# Altium footprint library LUMI_Handy_Soldering_LIB.PcbLib: 562 footprints (part 8 of 36)
Each footprint in its own frame and in the unit in brackets; x right, y up, seen from the top. Pads: shape width x height; smd on the part's side, far side on the other; paste and mask are expansions set on the pad; w line width, h text height; cw(c..) or ccw(c..) is an arc to the next point about the centre after c.
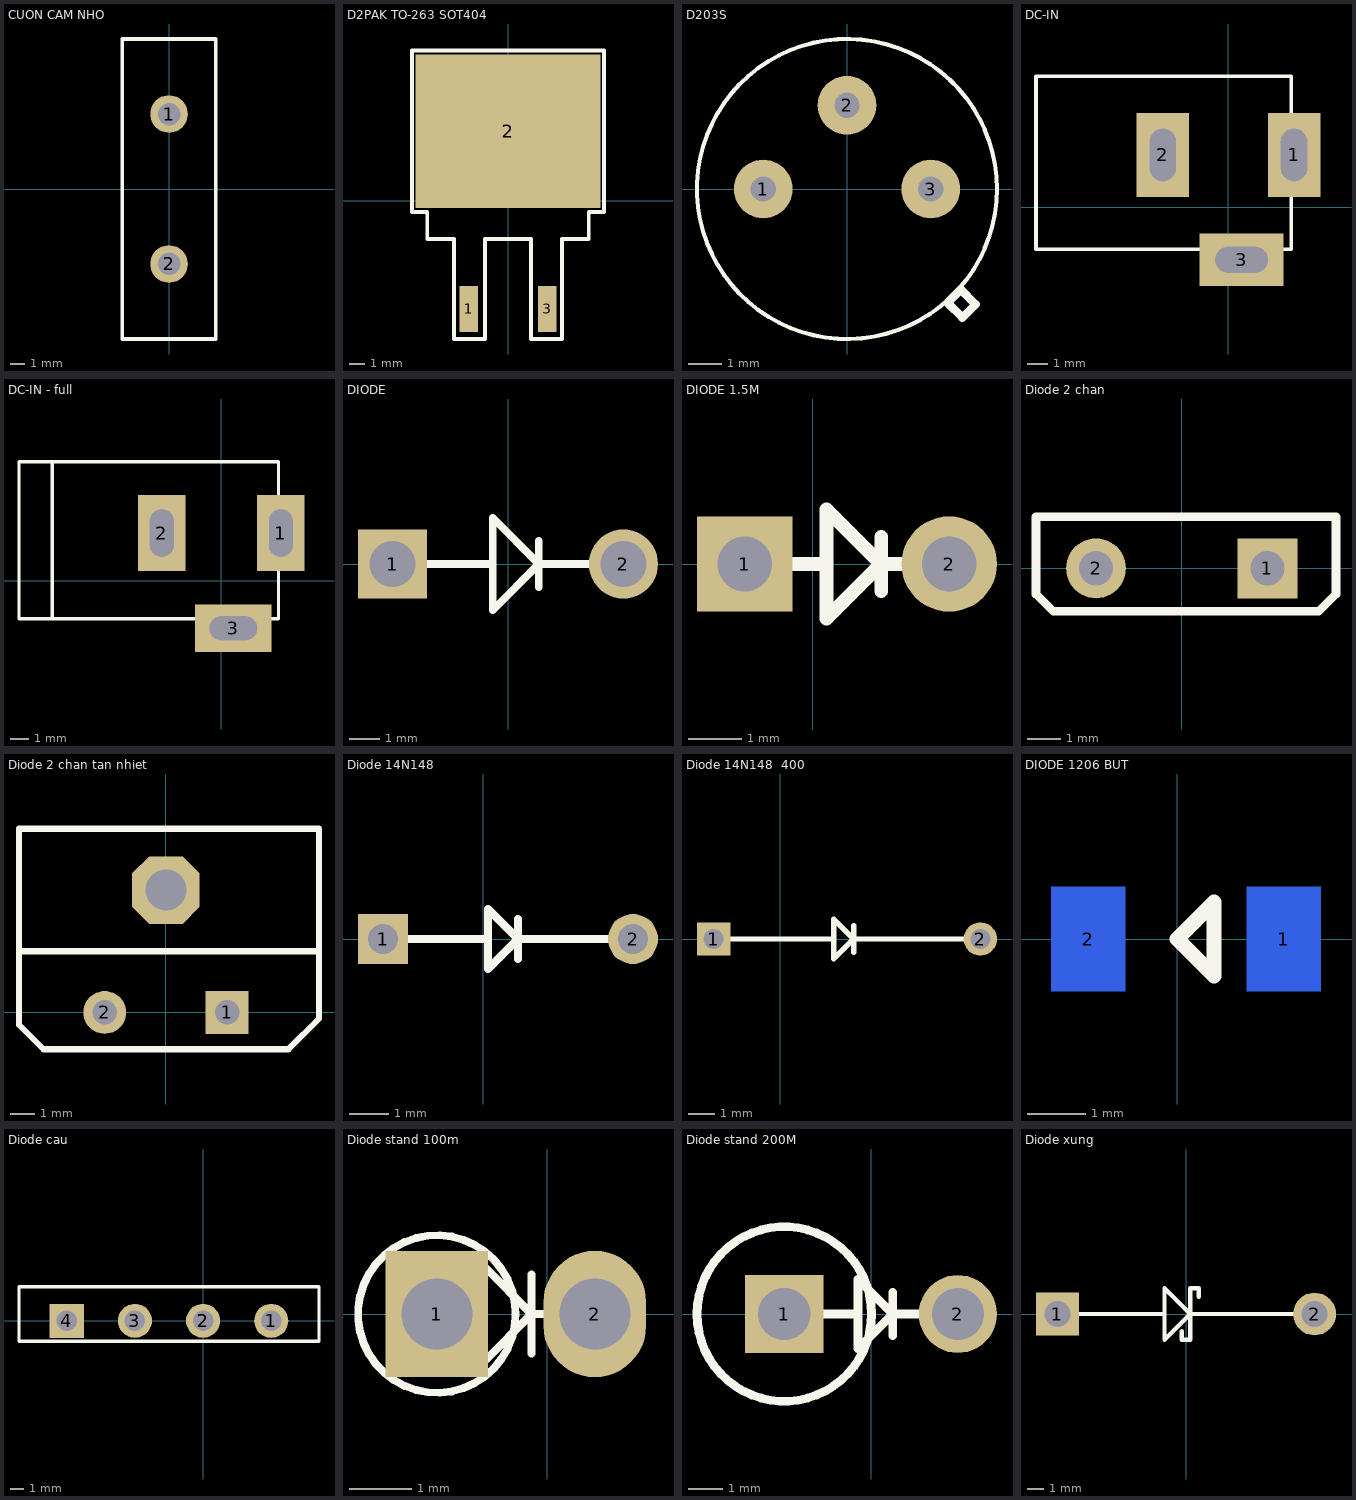
[diagram p7: the footprints below, top view; thin cyan lines are the x and y axes]

## CUON CAM NHO [mil]
pads (2):
  round 100 hole 60: 1(0,200) 2(0,-200)
Top Overlay:
  lines w10: -100,-400 125,-400 125,400 -125,400 -125,-400 100,-400

## D2PAK TO-263 SOT404 [mm]
pads (3):
  rect 1.2x3 smd: 1(-2.54,-7.04) 3(2.54,-7.04)
  rect 12x10 smd: 2(0,4.5)
Top Overlay:
  lines w0.254: -6.25,-0.75 -5.25,-0.75 -5.25,-2.5 -3.5,-2.5 -3.5,-9 -1.5,-9 -1.5,-2.5 1.5,-2.5 1.5,-9 3.5,-9 3.5,-2.5 5.25,-2.5 5.25,-0.75 6.25,-0.75 6.25,9.75 -6.25,9.75 -6.25,-0.75
3D body: height 4.92, standoff -0.09, extent -5.08,-7.133 5.08,8.131

## D203S [mil]
pads (3):
  round 70 hole 30: 1(-100,0) 2(0,100) 3(100,0)
Top Overlay:
  circle w5: c0,0 r179.13
  lines w10: 120.08,-135.83 135.83,-120.08 153.54,-137.8 137.8,-153.54 120.08,-135.83
3D body: height 185.04, standoff -78.74, extent -179.13,-177.93 179.14,179.14

## DC-IN [mil] "Jac DC input"
height 200
pads (3):
  rect 100x160 hole 50 slot 100 at 90 deg: 1(125,100) 2(-125,100)
  rect 160x100 hole 50 slot 100 at 0 deg: 3(25,-100)
Top Overlay:
  lines w7: -366.81,-80 120,-80 120,250 -366.81,250 -366.81,-80
3D body: height 433.67, standoff -137.2, extent -410.35,-105.12 134,269.12

## DC-IN - full [mil] "Jac DC input"
height 200
pads (3):
  rect 100x160 hole 50 slot 100 at 90 deg: 1(125,100) 2(-125,100)
  rect 160x100 hole 50 slot 100 at 0 deg: 3(25,-100)
Top Overlay:
  lines w7: -355,-80 -355,250 ; -425,-80 120,-80 120,250 -425,250 -425,-80
3D body: height 433.67, standoff -137.2, extent -410.35,-105.12 134,269.12

## DIODE [mil]
pads (2):
  rect 90x90 hole 60: 1(-150,0)
  round 90 hole 60: 2(150,0)
Top Overlay:
  lines w10: -140,0 -20,0 ; 40,-30 40,30 ; 150,0 40,0 ; 40,0 -20,-60 -20,60 40,0
3D body: height 125.98, standoff -133.86, extent -165.75,-61.98 165.75,64

## DIODE 1.5M [mil]
pads (2):
  rect 70x70 hole 40: 1(-50,0)
  round 70 hole 40: 2(100,0)
Top Overlay:
  lines w10: -20,0 -50,0 10,0 ; 50,-20 50,20 ; 100,0 50,0 ; 50,0 10,-40 10,40 50,0
3D body: height 50, standoff -280.46, extent -55.49,-52.49 112.51,52.51

## Diode 2 chan [mil]
pads (2):
  rect 70x70 hole 40: 1(100,0)
  round 70 hole 40: 2(-100,0)
Top Overlay:
  lines w10: -170,-30 -170,60 180,60 180,-30 160,-50 -150,-50 -170,-30
3D body: height 745.75, standoff -165, extent -165.66,-40 165.66,70

## Diode 2 chan tan nhiet [mil]
pads (3):
  rect 70x70 hole 40: 1(100,0)
  round 70 hole 40: 2(-100,0)
  oct 110.24x110.24 hole 66.93: ""(0,200)
Top Overlay:
  lines w10: -240,100 250,100 ; -240,-20 -200,-60 200,-60 250,-10 250,300 -240,300 -240,-20
3D body: height 980, standoff -142.05, extent -245.03,44 251.03,299.94
3D body: height 825.75, standoff -85, extent -165.66,-40 165.66,70

## Diode 14N148 [mil]
pads (2):
  rect 50x50 hole 30: 1(-100,0)
  round 50 hole 30: 2(150,0)
Top Overlay:
  lines w8: -100,0 0,0 ; 35,-20 35,20 ; 150,0 35,0 ; 35,0 5,30 5,-30 35,0
3D body: height 69.22, standoff -42, extent -83.5,-34.96 133.5,30

## Diode 14N148  400 [mil]
pads (2):
  rect 50x50 hole 30: 1(-100,0)
  round 50 hole 30: 2(300,0)
Top Overlay:
  lines w8: -100,0 80,0 ; 110,-20 110,20 ; 300,0 110,0 ; 110,0 80,-30 80,30 110,0
3D body: height 69.22, standoff -42, extent -17,-32.48 200,32.48

## DIODE 1206 BUT [mm]
pads (2):
  rect 1.27x1.8 smd far side: 1(1.829,0) 2(-1.524,0)
Top Overlay:
  lines w0.254: 0,0 0.635,-0.635 0.635,0.635 0,0
3D body: height -0.39, standoff -1.84, extent -1.75,-0.725 1.75,0.725

## Diode cau [mil]
pads (4):
  round 100 hole 60: 1(200,0) 2(0,0) 3(-200,0)
  rect 100x100 hole 60: 4(-400,0)
Top Overlay:
  lines w10: -540,-60 -540,100 340,100 340,-60 -540,-60
3D body: height 840.16, standoff -602.14, extent -538.98,-48.03 338.98,100

## Diode stand 100m [mil]
pads (2):
  rect 65x80 hole 45: 1(-70,0)
  oval 65x80 hole 45: 2(30,0)
Top Overlay:
  circle w5: c-70,0 r49.88
  lines w5: -70,0 -40,0 ; -10,-25 -10,25 ; 30,0 -10,0 ; -10,0 -40,30 -40,-30 -10,0
3D body: height 280.46, standoff -50, extent -123,-55 45,50

## Diode stand 200M [mil]
pads (2):
  rect 90x90 hole 60: 1(-100,0)
  round 90 hole 60: 2(100,0)
Top Overlay:
  circle w10: c-100,0 r100.5
  lines w10: -100,0 -15,0 ; 25,-25 25,25 ; 110,0 25,0 ; 25,0 -15,-40 -15,30 -15,40 25,0
3D body: height 494.09, standoff -255.91, extent -202.74,-102.36 121.65,102.76

## Diode xung [mil]
pads (2):
  rect 100x100 hole 60: 1(-300,0)
  round 100 hole 60: 2(300,0)
Top Overlay:
  lines w10: -300,0 -50,0 ; -10,-40 -10,-60 10,-60 10,60 30,60 30,40 ; 300,0 10,0 ; 10,0 -50,60 -50,-60 10,0
3D body: height 188.58, standoff -96.85, extent -321.85,-88.59 321.85,88.58